# Altium integrated library Samtec_2_mm_Pitch_Socket_Strips.IntLib: 251 symbols (part 3 of 3)
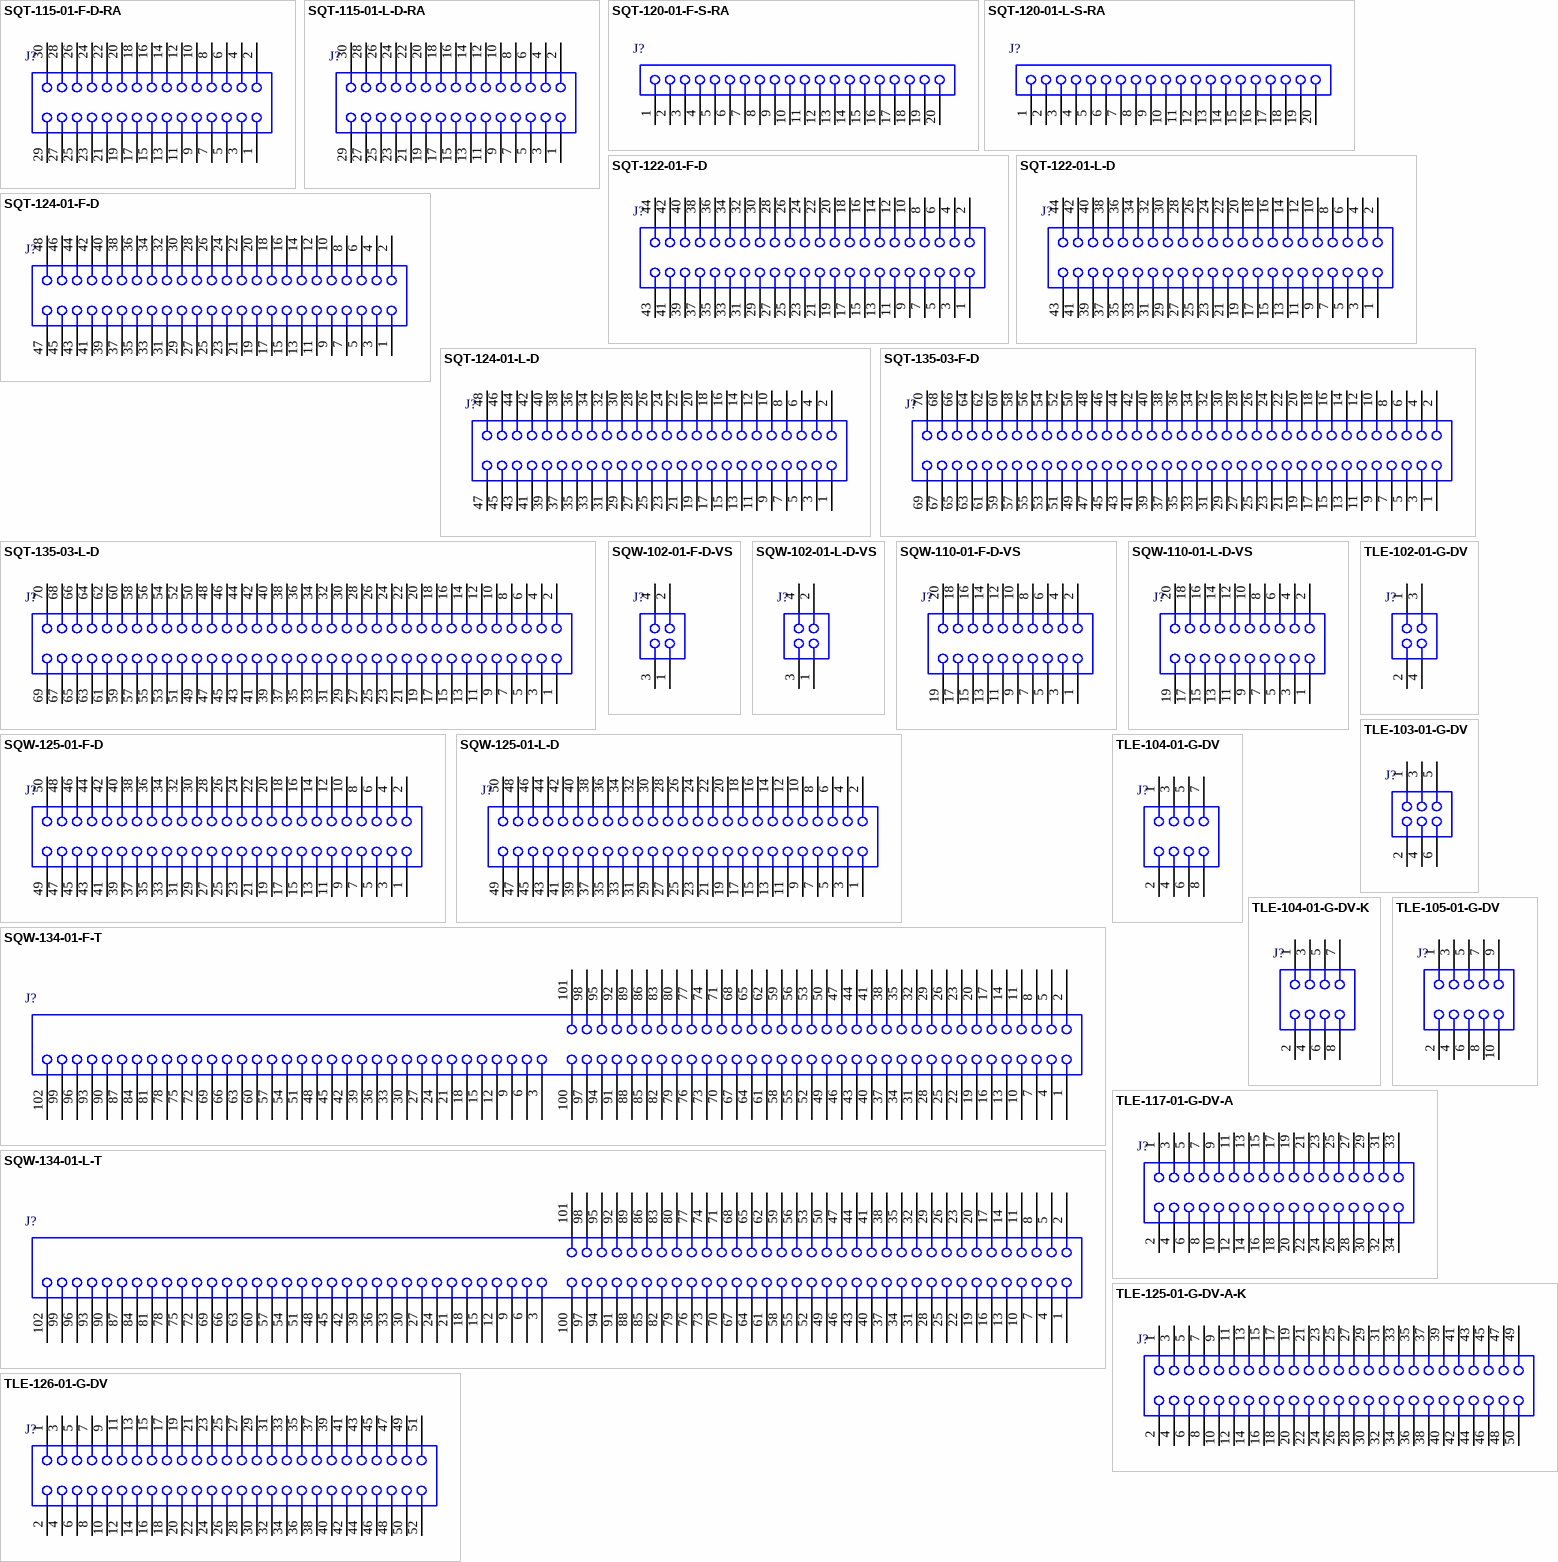
[diagram p8: symbols SQT-115-01-F-D-RA to TLE-126-01-G-DV]

## TLE-125-01-G-DV-A-K
designator J?
Cost-Effective Reliable Socket, Surface Mount, Vertical, -55 to 125 degC, 2 mm Pitch, 50-Pin, Female, RoHS; Manufacturer: Samtec; PartNumber: TLE-125-01-G-DV-A-K; Pitch: 2 mm; DatasheetVersion: F-214; PackageVersion: AC, 1/1997; PackageReference: TLE-125-01-X-DV-A-K; PackageDescription: Dual Row 2 mm x 2 mm Assembly; Orientation: Vertical; RoHS: True; Temperature Range: -55 to 125 degC; Mounting Technology: Surface Mount; ComponentLink1Description: Manufacturer URL; ComponentLink1URL: http://www.samtec.com; ComponentLink2Description: Datasheet; ComponentLink2URL: http://www.samtec.com/documents/webfiles/pdf/TLE.PDF; ComponentLink3Description: Package Specification; ComponentLink3URL: http://www.samtec.com/documents/webfiles/cpdf/TLE-1XX-XX-X-DV-X-MKT2.pdf
footprint SMTC-TLE-125-01-X-DV-A-K (Dual Row Assembly, 2x25 Pins, Vertical, 2mm Pitch, Female)
pins: 1, 2, 3, 4, 5, 6, 7, 8, 9, 10, 11, 12, 13, 14, 15, 16, 17, 18, 19, 20, 21, 22, 23, 24, 25, 26, 27, 28, 29, 30, 31, 32, 33, 34, 35, 36, 37, 38, 39, 40, 41, 42, 43, 44, 45, 46, 47, 48, 49, 50

## TLE-126-01-G-DV
designator J?
Cost-Effective Reliable Socket, Surface Mount, Vertical, -55 to 125 degC, 2 mm Pitch, 52-Pin, Female, RoHS; Manufacturer: Samtec; PartNumber: TLE-126-01-G-DV; Pitch: 2 mm; DatasheetVersion: F-214; PackageVersion: AC, 1/1997; PackageReference: TLE-126-01-X-DV; PackageDescription: Dual Row 2 mm x 2 mm Assembly; Supplier 1: Digi-Key; Supplier Part Number 1: SAM1251-26-ND; Supplier 2: Newark; Supplier Part Number 2: 12P0346; Orientation: Vertical; RoHS: True; Temperature Range: -55 to 125 degC; Mounting Technology: Surface Mount; ComponentLink1Description: Manufacturer URL; ComponentLink1URL: http://www.samtec.com; ComponentLink2Description: Datasheet; ComponentLink2URL: http://www.samtec.com/documents/webfiles/pdf/TLE.PDF; ComponentLink3Description: Package Specification; ComponentLink3URL: http://www.samtec.com/documents/webfiles/cpdf/TLE-1XX-XX-X-DV-X-MKT2.pdf
footprint SMTC-TLE-126-01-X-DV (Dual Row Assembly, 2x26 Pins, Vertical, 2mm Pitch, Female)
pins: 1, 2, 3, 4, 5, 6, 7, 8, 9, 10, 11, 12, 13, 14, 15, 16, 17, 18, 19, 20, 21, 22, 23, 24, 25, 26, 27, 28, 29, 30, 31, 32, 33, 34, 35, 36, 37, 38, 39, 40, 41, 42, 43, 44, 45, 46, 47, 48, 49, 50, 51, 52